# Altium footprint library North POLE.PcbLib: 419 footprints (part 1 of 27)
Each footprint in its own frame and in the unit in brackets; x right, y up, seen from the top. Pads: shape width x height; smd on the part's side, far side on the other; paste and mask are expansions set on the pad; w line width, h text height; cw(c..) or ccw(c..) is an arc to the next point about the centre after c.
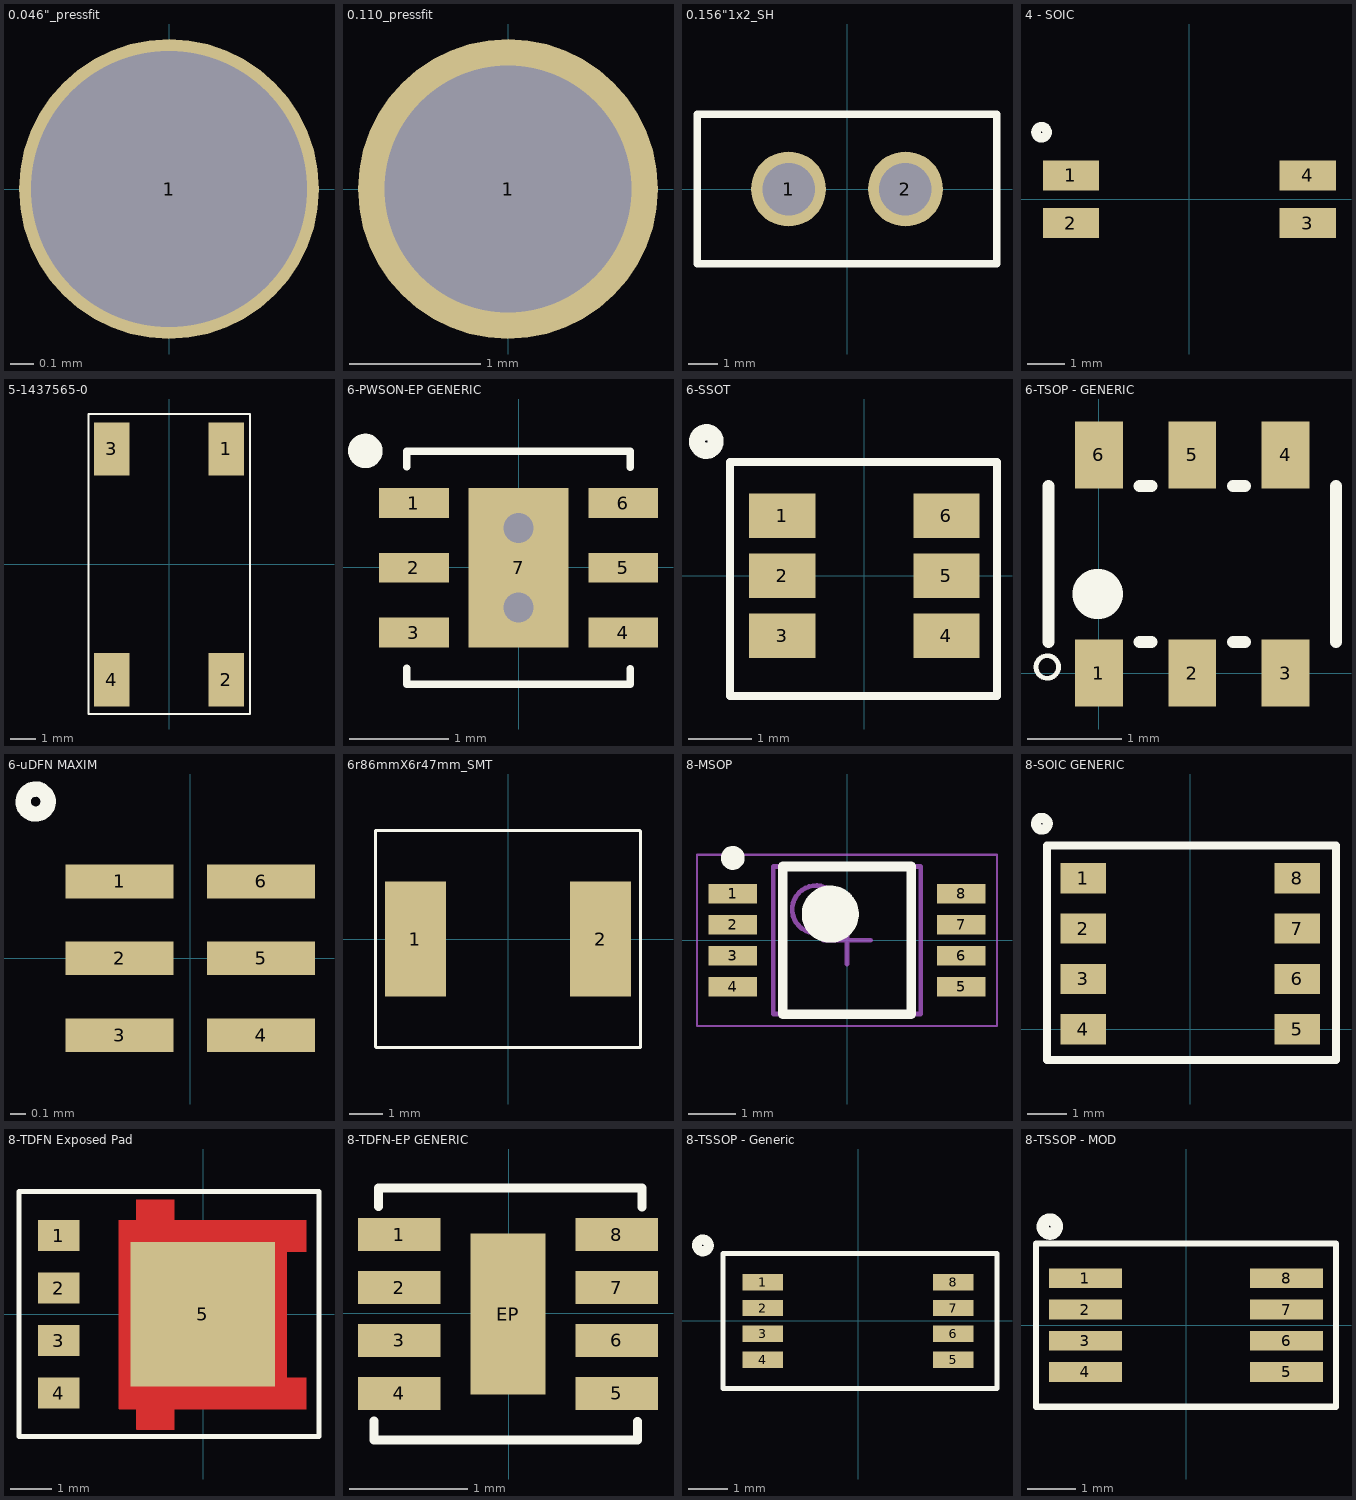
[diagram p0: the footprints below, top view; thin cyan lines are the x and y axes]

## 0.046"_pressfit [mil]
pads (1):
  round 50 hole 46 mask+1.57: 1(0,0)

## 0.110_pressfit [mil]
pads (1):
  round 90 hole 74.02 mask+1.57: 1(0,0)

## 0.156"1x2_SH [mil] "0.156-inch-separation 1x2 header with shroud"
pads (2):
  round 100 hole 70: 1(-78,0) 2(78,0)
Top Overlay:
  lines w10: -200,-100 200,-100 200,100 -200,100 -200,-100

## 4 - SOIC [mm]
pads (4):
  rect 1.5x0.8 smd: 1(-3.15,0.635) 2(-3.15,-0.635) 3(3.15,-0.635) 4(3.15,0.635)
Top Overlay:
  lines w0.254: -3.842,1.901 ccw(c-3.932,1.784) -3.82,1.88
3D body: height 2, standoff 0, extent -3.16,-1.35 3.23,1.4

## 5-1437565-0 [mm]
pads (4):
  rect 1.4x2.1 smd mask+0.08: 1(2.25,4.55) 2(2.25,-4.55) 3(-2.25,4.55) 4(-2.25,-4.55)
Top Overlay:
  lines w0.076: -3.174,-5.9 -3.174,5.926 3.2,5.926 3.2,-5.9 -3.174,-5.9
3D body: height 7.05, standoff -0.06, extent -3,-5 3,5

## 6-PWSON-EP GENERIC [mm]
pads (7):
  rect 0.7x0.3 smd mask+0.05: 1(-1.054,0.644) 2(-1.054,-0.006) 3(-1.054,-0.656) 4(1.046,-0.656) 5(1.046,-0.006) 6(1.046,0.644)
  rect 1x1.6 smd mask+0.05: 7(-0.004,-0.006)
via -0.004,-0.406 diameter 0.45 hole 0.3
via -0.004,0.394 diameter 0.45 hole 0.3
Top Overlay:
  lines w0.076: -1.125,1.006 -1.125,1.164 1.116,1.164 1.116,1.003 ; -1.124,-1.015 -1.124,-1.176 1.117,-1.176 1.117,-1.018
  lines w0.2: -1.504,1.229 ccw(c-1.542,1.167) -1.482,1.208
3D body: height 0.75, standoff 0, extent -1.013,-1.011 1.067,0.998

## 6-SSOT [mm]
pads (6):
  rect 1.05x0.7 smd: 1(-1.3,0.95) 2(-1.3,0) 3(-1.3,-0.95) 4(1.3,-0.95) 5(1.3,0) 6(1.3,0.95)
Top Overlay:
  lines w0.127: -2.125,-1.9 -2.125,1.8 2.1,1.8 2.1,-1.9 -2.125,-1.9
  lines w0.254: -2.409,2.242 ccw(c-2.5,2.125) -2.388,2.221
3D body: height 1.3, standoff 0, extent -1.5,-1.499 1.5,1.501

## 6-TSOP - GENERIC [mil]
pads (6):
  rect 20x28 smd: 1(0,0) 2(39,0) 3(78,0) 4(78,91) 5(39,91) 6(0,91)
Top Overlay:
  circle w2: c-21.5,2.5 r4.72
  circle w20: c-0.5,33 r0.5
  lines w5: -21,13 -21,78 ; 17,13 22,13 ; 17,78 22,78 ; 56,13 61,13 ; 56,78 61,78 ; 99,13 99,78

## 6-uDFN MAXIM [mm]
pads (6):
  rect 0.7x0.22 smd mask+0.08: 1(-0.46,0.5) 2(-0.46,0) 3(-0.46,-0.5) 4(0.46,-0.5) 5(0.46,0) 6(0.46,0.5)
Top Overlay:
  lines w0.1: -0.961,1.087 ccw(c-1.006,1.019) -0.94,1.067
3D body: height 0.8, standoff 0, extent -0.508,-0.762 0.584,0.762

## 6r86mmX6r47mm_SMT [mm]
pads (2):
  rect 1.83x3.43 smd mask+0.08: 1(-2.77,0) 2(2.77,0)
Top Overlay:
  lines w0.1: -3.96,-3.23 -3.962,3.242 3.948,3.242 ; -3.948,-3.242 3.962,-3.242 3.96,3.23

## 8-MSOP [mm]
height 1.09
pads (8):
  rect 1.02x0.41 smd: 1(-2.4,0.975) 2(-2.4,0.325) 3(-2.4,-0.325) 4(-2.4,-0.975) 5(2.4,-0.975) 6(2.4,-0.325) 7(2.4,0.325) 8(2.4,0.975)
Top Overlay:
  circle w0.25: c-2.4,1.73 r0.125
  circle w0.6: c-0.35,0.55 r0.3
  lines w0.2: -1.35,-1.55 -1.35,1.55 1.35,1.55 1.35,-1.55 -1.35,-1.55
Mechanical 13:
  circle w0.1: c-0.65,0.65 r0.5
  lines w0.1: -1.55,-1.55 -1.55,1.55 1.55,1.55 1.55,-1.55 -1.55,-1.55
Mechanical 15:
  lines w0.05: -3.15,-1.8 -3.15,1.8 3.15,1.8 3.15,-1.8 -3.15,-1.8
  lines w0.1: -0.5,0 0.5,0 ; 0,-0.5 0,0.5
3D body: height 1.1, standoff 0, extent -2.469,-1.55 2.469,1.55

## 8-SOIC GENERIC [mil]
pads (8):
  rect 45x30 smd: 1(-106.3,150) 2(-106.3,100) 3(-106.3,50) 4(-106.3,0) 5(106.3,0) 6(106.3,50) 7(106.3,100) 8(106.3,150)
Top Overlay:
  lines w7.87: -142.13,-30.63 144.69,-30.63 144.69,182.52 -142.13,182.52 -142.13,-30.63
  lines w10: -143.85,208.81 ccw(c-147.43,204.21) -143,208
3D body: height 68.9, standoff 0, extent -118.11,-21.45 118.11,171.46

## 8-TDFN Exposed Pad [mm]
pads (5):
  rect 1x0.75 smd: 1(-3.493,1.906) 2(-3.493,0.636) 3(-3.493,-0.634) 4(-3.493,-1.904)
  rect 3.5x3.5 smd: 5(-0.008,0.005)
Top Layer:
  region: -1.605,-2.775 -1.605,-2.28 -2.027,-2.28 -2.027,2.28 -1.605,2.28 -1.605,2.775 -0.7,2.775 -0.7,2.28 2.5,2.28 2.5,1.53 2.027,1.53 2.027,-1.53 2.5,-1.53 2.5,-2.28 -0.7,-2.28 -0.7,-2.775
  lines w0: -2.027,-2.28 -2.027,2.28 -1.605,2.28 -1.605,2.775 -0.7,2.775 -0.7,2.28 2.5,2.28 2.5,1.53 2.027,1.53 2.027,-1.53 2.5,-1.53 2.5,-2.28 -0.7,-2.28 -0.7,-2.775 -1.605,-2.775 -1.605,-2.28 -2.027,-2.28
Top Overlay:
  lines w0.127: -4.453,-2.957 -4.453,2.975 2.807,2.975 2.807,-2.957 -4.453,-2.957
3D body: height 1.12, standoff 0, extent -4.453,-2.539 2.807,2.541

## 8-TDFN-EP GENERIC [mm]
pads (9):
  rect 0.7x0.28 smd mask+0.05: 1(-0.93,0.67) 2(-0.93,0.22) 3(-0.93,-0.23) 4(-0.93,-0.68) 5(0.92,-0.68) 6(0.92,-0.23) 7(0.92,0.22) 8(0.92,0.67)
  rect 0.64x1.37 smd mask+0.05: EP(-0.005,-0.005)
Top Overlay:
  lines w0.076: -1.145,-0.914 -1.145,-1.075 1.096,-1.075 1.096,-0.917 ; -1.106,0.907 -1.106,1.065 1.135,1.065 1.135,0.904
3D body: height 0.75, standoff 0, extent -1.014,-1.01 1.066,0.999

## 8-TSSOP - Generic [mm]
pads (8):
  rect 1.02x0.41 smd: 1(-2.4,0.975) 2(-2.4,0.325) 3(-2.4,-0.325) 4(-2.4,-0.975) 5(2.4,-0.975) 6(2.4,-0.325) 7(2.4,0.325) 8(2.4,0.975)
Top Overlay:
  lines w0.127: -3.4,-1.7 -3.4,1.7 3.5,1.7 3.5,-1.7 -3.4,-1.7
  lines w0.254: -3.822,2.021 ccw(c-3.912,1.904) -3.8,2
3D body: height 1.1, standoff 0, extent -2.525,-1.55 2.475,1.55

## 8-TSSOP - MOD [mm]
pads (8):
  rect 1.524x0.41 smd: 1(-2.095,0.975) 2(-2.095,0.325) 3(-2.095,-0.325) 4(-2.095,-0.975) 5(2.095,-0.975) 6(2.095,-0.325) 7(2.095,0.325) 8(2.095,0.975)
Top Overlay:
  lines w0.127: -3.125,-1.7 -3.125,1.7 3.125,1.7 3.125,-1.7 -3.125,-1.7
  lines w0.254: -2.747,2.171 ccw(c-2.837,2.054) -2.725,2.15
3D body: height 1.1, standoff 0, extent -2.525,-1.55 2.475,1.55